# Altium integrated library 兰格封装.IntLib: 1176 symbols (part 4 of 6) (continued)
## RES  0603  15K
designator R?, comment 15K
0603  15K  5%  贴片电阻; 物料代码: 3.01.03.01.01.0026; 仓库名称: 元件仓; 助记码: 0603  15K  5%  TPDZ; 单位: ֻ; 加工方式: 贴片; 物料名称: 0603  15K  5%  贴片电阻; 规格型号: *
footprint R0603
pins: 1, 2
2 alternate drawings of the same symbol

## RES  0603  15R
designator R?, comment 15R
0603 15R 5% 贴片电阻; 物料代码: 3.01.03.01.01.0080; 助记码: 0603 15R 5% TPDZ; 仓库名称: 元件仓; 单位: ֻ; 加工方式: 贴片; 物料名称: 0603 15R 5% 贴片电阻; 规格型号: *
footprint R0603
pins: 1, 2
2 alternate drawings of the same symbol

## RES  0603  16K
designator R?, comment 16K
0603 16K 5% 贴片电阻; 物料代码: 3.01.03.01.01.0056; 仓库名称: 元件仓; 助记码: 0603 16K 5% TPDZ; 单位: ֻ; 加工方式: 贴片; 物料名称: 0603 16K 5% 贴片电阻; 规格型号: *
footprint R0603
pins: 1, 2
2 alternate drawings of the same symbol

## RES  0603  16R
designator R?, comment 16R
0603 16R 5% 贴片电阻; 物料代码: 3.01.03.01.01.0126; 助记码: 0603 16R 5% TPDZ; 仓库名称: 元件仓; 单位: ֻ; 加工方式: 贴片; 物料名称: 0603 16R 5% 贴片电阻; 规格型号: *
footprint R0603
pins: 1, 2
2 alternate drawings of the same symbol

## RES  0603  18K
designator R?, comment 18K
0603 18K 5% 贴片电阻; 物料代码: 3.01.03.01.01.0057; 仓库名称: 元件仓; 助记码: 0603 18K 5% TPDZ; 单位: ֻ; 加工方式: 贴片; 物料名称: 0603 18K 5% 贴片电阻; 规格型号: *
footprint R0603
pins: 1, 2
2 alternate drawings of the same symbol

## RES  0603  18R
designator R?, comment 18R
0603 18R 5% 贴片电阻; 物料代码: 3.01.03.01.01.0038; 助记码: 0603 18R 5% TPDZ; 仓库名称: 元件仓; 单位: ֻ; 加工方式: 贴片; 物料名称: 0603 18R 5% 贴片电阻; 规格型号: *
footprint R0603
pins: 1, 2
2 alternate drawings of the same symbol

## RES  0603  20K
designator R?, comment 20K
0603  20K  5%  贴片电阻; 物料代码: 3.01.03.01.01.0058; 仓库名称: 元件仓; 助记码: 0603  20K  5%  TPDZ; 单位: ֻ; 加工方式: 贴片; 物料名称: 0603  20K  5%  贴片电阻; 规格型号: *
footprint R0603
pins: 1, 2
2 alternate drawings of the same symbol

## RES  0603  20R
designator R?, comment 20R
0603 20R 5% 贴片电阻; 物料代码: 3.01.03.01.01.0127; 助记码: 0603 20R 5% TPDZ; 仓库名称: 元件仓; 单位: ֻ; 加工方式: 贴片; 物料名称: 0603 20R 5% 贴片电阻; 规格型号: *
footprint R0603
pins: 1, 2
2 alternate drawings of the same symbol

## RES  0603  22K
designator R?, comment 22K
0603  22K  5%  贴片电阻; 物料代码: 3.01.03.01.01.0008; 仓库名称: 元件仓; 单位: ֻ; 加工方式: 贴片; 物料名称: 0603  22K  5%  贴片电阻; 助记码: *; 规格型号: *
footprint R0603
pins: 1, 2
2 alternate drawings of the same symbol

## RES  0603  22R
designator R?, comment 22R
0603  22R  5%  贴片电阻; 物料代码: 3.01.03.01.01.0039; 助记码: 0603  22R  5%  TPDZ; 仓库名称: 元件仓; 单位: ֻ; 加工方式: 贴片; 物料名称: 0603  22R  5%  贴片电阻; 规格型号: *
footprint R0603
pins: 1, 2
2 alternate drawings of the same symbol

## RES  0603  24K
designator R?, comment 24K
0603 24K 5% 贴片电阻; 物料代码: 3.01.03.01.01.0059; 助记码: 0603 24K 5% TPDZ; 仓库名称: 元件仓; 单位: ֻ; 加工方式: 贴片; 物料名称: 0603 24K 5% 贴片电阻; 规格型号: *
footprint R0603
pins: 1, 2
2 alternate drawings of the same symbol

## RES  0603  24R
designator R?, comment 24R
0603 24R 5% 贴片电阻; 物料代码: 3.01.03.01.01.0128; 助记码: 0603 24R 5% TPDZ; 仓库名称: 元件仓; 单位: ֻ; 加工方式: 贴片; 物料名称: 0603 24R 5% 贴片电阻; 规格型号: *
footprint R0603
pins: 1, 2
2 alternate drawings of the same symbol

## RES  0603  27K
designator R?, comment 27K
0603  27K  5%  贴片电阻; 助记码: 0603  27K  5%  TPDZ; 物料代码: 3.01.03.01.01.0027; 仓库名称: 元件仓; 单位: ֻ; 加工方式: 贴片; 物料名称: 0603  27K  5%  贴片电阻; 规格型号: *
footprint R0603
pins: 1, 2
2 alternate drawings of the same symbol

## RES  0603  27R
designator R?, comment 27R
0603 27R 5% 贴片电阻; 物料代码: 3.01.03.01.01.0040; 助记码: 0603 27R 5% TPDZ; 仓库名称: 元件仓; 单位: ֻ; 加工方式: 贴片; 物料名称: 0603 27R 5% 贴片电阻; 规格型号: *
footprint R0603
pins: 1, 2
2 alternate drawings of the same symbol

## RES  0603  30R
designator R?, comment 30R
0603 30R 5% 贴片电阻; 物料代码: 3.01.03.01.01.0041; 助记码: 0603 30R 5% TPDZ; 仓库名称: 元件仓; 单位: ֻ; 加工方式: 贴片; 物料名称: 0603 30R 5% 贴片电阻; 规格型号: *
footprint R0603
pins: 1, 2
2 alternate drawings of the same symbol

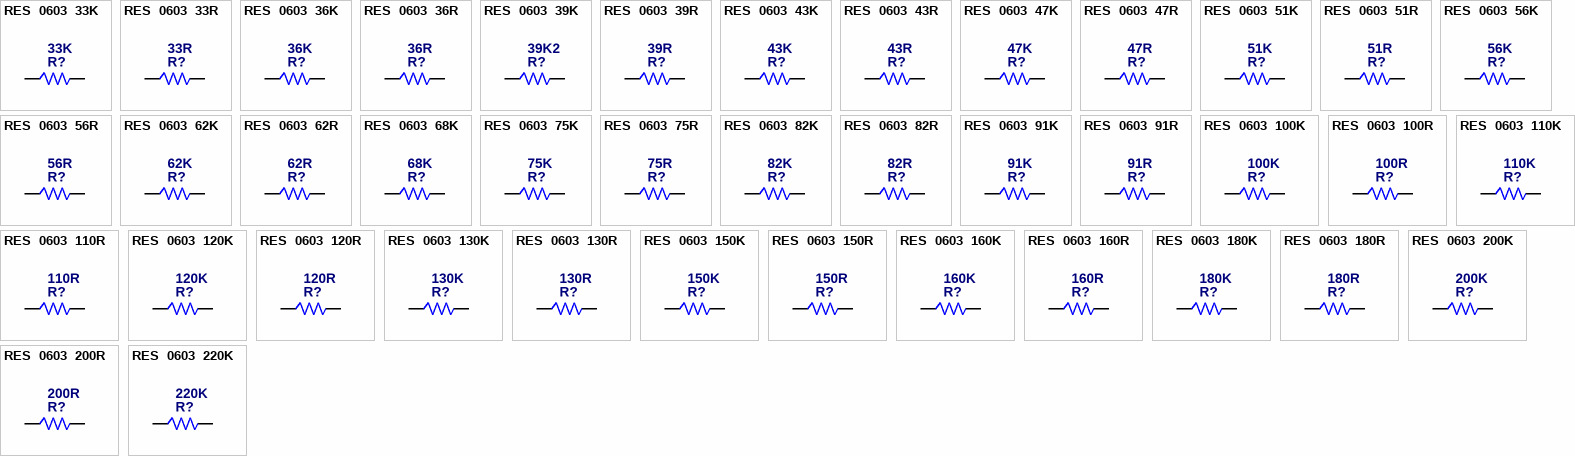
[diagram p37: symbols RES  0603  33K to RES  0603  220K]

## RES  0603  33K
designator R?, comment 33K
0603  33K  5%  贴片电阻; 物料代码: 3.01.03.01.01.0028; 仓库名称: 元件仓; 助记码: 0603  33K  5%  TPDZ; 单位: ֻ; 加工方式: 贴片; 物料名称: 0603  33K  5%  贴片电阻; 规格型号: *
footprint R0603
pins: 1, 2
2 alternate drawings of the same symbol

## RES  0603  33R
designator R?, comment 33R
0603  33R  5%  贴片电阻; 物料代码: 3.01.03.01.01.0081; 助记码: 0603  33R  5%  TPDZ; 仓库名称: 元件仓; 单位: ֻ; 加工方式: 贴片; 物料名称: 0603  33R  5%  贴片电阻; 规格型号: *
footprint R0603
pins: 1, 2
2 alternate drawings of the same symbol

## RES  0603  36K
designator R?, comment 36K
0603 36K 5% 贴片电阻; 物料代码: 3.01.03.01.01.0107; 仓库名称: 元件仓; 助记码: 0603 36K 5% TPDZ; 单位: ֻ; 加工方式: 贴片; 物料名称: 0603 36K 5% 贴片电阻; 规格型号: *
footprint R0603
pins: 1, 2
2 alternate drawings of the same symbol

## RES  0603  36R
designator R?, comment 36R
0603 36R 5% 贴片电阻; 物料代码: 3.01.03.01.01.0129; 助记码: 0603 36R 5% TPDZ; 仓库名称: 元件仓; 单位: ֻ; 加工方式: 贴片; 物料名称: 0603 36R 5% 贴片电阻; 规格型号: *
footprint R0603
pins: 1, 2
2 alternate drawings of the same symbol

## RES  0603  39K
designator R?, comment 39K2
0603  39K  5%  贴片电阻; 物料代码: 3.01.03.01.01.0108; 助记码: 0603  39K  5%  TPDZ; 仓库名称: 元件仓; 单位: ֻ; 加工方式: 贴片; 物料名称: 0603  39K  5%  贴片电阻; 规格型号: *
footprint R0603
pins: 1, 2
2 alternate drawings of the same symbol

## RES  0603  39R
designator R?, comment 39R
0603 39R 5% 贴片电阻; 物料代码: 3.01.03.01.01.0082; 助记码: 0603 39R 5% TPDZ; 仓库名称: 元件仓; 单位: ֻ; 加工方式: 贴片; 物料名称: 0603 39R 5% 贴片电阻; 规格型号: *
footprint R0603
pins: 1, 2
2 alternate drawings of the same symbol

## RES  0603  43K
designator R?, comment 43K
0603 43K 5% 贴片电阻; 物料代码: 3.01.03.01.01.0061; 仓库名称: 元件仓; 助记码: 0603 43K 5% TPDZ; 单位: ֻ; 加工方式: 贴片; 物料名称: 0603 43K 5% 贴片电阻; 规格型号: *
footprint R0603
pins: 1, 2
2 alternate drawings of the same symbol

## RES  0603  43R
designator R?, comment 43R
0603 43R 5% 贴片电阻; 物料代码: 3.01.03.01.01.0130; 单位: ֻ; 仓库名称: 元件仓; 助记码: 0603 43R 5% TPDZ; 加工方式: 贴片; 物料名称: 0603 43R 5% 贴片电阻; 规格型号: *
footprint R0603
pins: 1, 2
2 alternate drawings of the same symbol

## RES  0603  47K
designator R?, comment 47K
0603  47K  5%  贴片电阻; 物料代码: 3.01.03.01.01.0009; 仓库名称: 元件仓; 单位: ֻ; 加工方式: 贴片; 物料名称: 0603  47K  5%  贴片电阻; 规格型号: *; 助记码: *
footprint R0603
pins: 1, 2
2 alternate drawings of the same symbol

## RES  0603  47R
designator R?, comment 47R
0603  47R  5%  贴片电阻; 物料代码: 3.01.03.01.01.0013; 单位: ֻ; 仓库名称: 元件仓; 加工方式: 贴片; 物料名称: 0603  47R  5%  贴片电阻; 规格型号: *; 助记码: *
footprint R0603
pins: 1, 2
2 alternate drawings of the same symbol

## RES  0603  51K
designator R?, comment 51K
0603 51K 5% 贴片电阻; 物料代码: 3.01.03.01.01.0062; 仓库名称: 元件仓; 助记码: 0603 51K 5% TPDZ; 单位: ֻ; 加工方式: 贴片; 物料名称: 0603 51K 5% 贴片电阻; 规格型号: *
footprint R0603
pins: 1, 2
2 alternate drawings of the same symbol

## RES  0603  51R
designator R?, comment 51R
0603 51R 5% 贴片电阻; 物料代码: 3.01.03.01.01.0083; 仓库名称: 元件仓; 助记码: 0603 51R 5% TPDZ; 单位: ֻ; 加工方式: 贴片; 物料名称: 0603 51R 5% 贴片电阻; 规格型号: *
footprint R0603
pins: 1, 2
2 alternate drawings of the same symbol

## RES  0603  56K
designator R?, comment 56K
0603  56K  5%  贴片电阻; 物料代码: 3.01.03.01.01.0029; 仓库名称: 元件仓; 助记码: 0603  56K  5%  TPDZ; 单位: ֻ; 加工方式: 贴片; 物料名称: 0603  56K  5%  贴片电阻; 规格型号: *
footprint R0603
pins: 1, 2
2 alternate drawings of the same symbol

## RES  0603  56R
designator R?, comment 56R
0603 56R 5% 贴片电阻; 物料代码: 3.01.03.01.01.0084; 仓库名称: 元件仓; 助记码: 0603 56R 5% TPDZ; 单位: ֻ; 加工方式: 贴片; 物料名称: 0603 56R 5% 贴片电阻; 规格型号: *
footprint R0603
pins: 1, 2
2 alternate drawings of the same symbol

## RES  0603  62K
designator R?, comment 62K
0603 62K 5% 贴片电阻; 物料代码: 3.01.03.01.01.0063; 助记码: 0603 62K 5% TPDZ; 仓库名称: 元件仓; 单位: ֻ; 加工方式: 贴片; 物料名称: 0603 62K 5% 贴片电阻; 规格型号: *
footprint R0603
pins: 1, 2
2 alternate drawings of the same symbol

## RES  0603  62R
designator R?, comment 62R
0603 62R 5% 贴片电阻; 物料代码: 3.01.03.01.01.0085; 助记码: 0603 62R 5% TPDZ; 仓库名称: 元件仓; 单位: ֻ; 加工方式: 贴片; 物料名称: 0603 62R 5% 贴片电阻; 规格型号: *
footprint R0603
pins: 1, 2
2 alternate drawings of the same symbol

## RES  0603  68K
designator R?, comment 68K
0603  68K  5%  贴片电阻; 物料代码: 3.01.03.01.01.0064; 助记码: 0603  68K  5%  TPDZ; 仓库名称: 元件仓; 单位: ֻ; 加工方式: 贴片; 物料名称: 0603  68K  5%  贴片电阻; 规格型号: *
footprint R0603
pins: 1, 2
2 alternate drawings of the same symbol

## RES  0603  75K
designator R?, comment 75K
0603  75K  5%  贴片电阻; 物料代码: 3.01.03.01.01.0065; 助记码: 0603  75K  5%  TPDZ; 仓库名称: 元件仓; 单位: ֻ; 加工方式: 贴片; 物料名称: 0603  75K  5%  贴片电阻; 规格型号: *
footprint R0603
pins: 1, 2
2 alternate drawings of the same symbol

## RES  0603  75R
designator R?, comment 75R
0603  75R  5%  贴片电阻; 物料代码: 3.01.03.01.01.0014; 仓库名称: 元件仓; 单位: ֻ; 加工方式: 贴片; 物料名称: 0603  75R  5%  贴片电阻; 规格型号: *; 助记码: *
footprint R0603
pins: 1, 2
2 alternate drawings of the same symbol

## RES  0603  82K
designator R?, comment 82K
0603  82K  5%  贴片电阻; 物料代码: 3.01.03.01.01.0030; 助记码: 0603  82K  5%  TPDZ; 仓库名称: 元件仓; 单位: ֻ; 加工方式: 贴片; 物料名称: 0603  82K  5%  贴片电阻; 规格型号: *
footprint R0603
pins: 1, 2
2 alternate drawings of the same symbol

## RES  0603  82R
designator R?, comment 82R
0603 82R 5% 贴片电阻; 物料代码: 3.01.03.01.01.0086; 助记码: 0603 82R 5% TPDZ; 仓库名称: 元件仓; 单位: ֻ; 加工方式: 贴片; 物料名称: 0603 82R 5% 贴片电阻; 规格型号: *
footprint R0603
pins: 1, 2
2 alternate drawings of the same symbol

## RES  0603  91K
designator R?, comment 91K
0603  91K 5% 贴片电阻; 物料代码: 3.01.03.01.01.0109; 助记码: 0603 91K 5% TPDZ; 仓库名称: 元件仓; 单位: ֻ; 加工方式: 贴片; 物料名称: 0603 91K 5% 贴片电阻; 规格型号: *
footprint R0603
pins: 1, 2
2 alternate drawings of the same symbol

## RES  0603  91R
designator R?, comment 91R
0603 91R 5% 贴片电阻; 物料代码: 3.01.03.01.01.0135; 助记码: 0603 91R 5% TPDZ; 仓库名称: 元件仓; 单位: ֻ; 加工方式: 贴片; 物料名称: 0603 91R 5% 贴片电阻; 规格型号: *
footprint R0603
pins: 1, 2
2 alternate drawings of the same symbol

## RES  0603  100K
designator R?, comment 100K
0603  100K  5%  贴片电阻; 物料代码: 3.01.03.01.01.0010; 仓库名称: 元件仓; 单位: ֻ; 加工方式: 贴片; 物料名称: 0603  100K  5%  贴片电阻; 规格型号: *; 助记码: *
footprint R0603
pins: 1, 2
2 alternate drawings of the same symbol

## RES  0603  100R
designator R?, comment 100R
0603  100R  5%  贴片电阻; 物料代码: 3.01.03.01.01.0015; 仓库名称: 元件仓; 单位: ֻ; 加工方式: 贴片; 物料名称: 0603  100R  5%  贴片电阻; 助记码: *; 规格型号: *
footprint R0603
pins: 1, 2
2 alternate drawings of the same symbol

## RES  0603  110K
designator R?, comment 110K
0603 110K 5% 贴片电阻; 物料代码: 3.01.03.01.01.0146; 助记码: 0603 110K 5% TPDZ; 仓库名称: 元件仓; 单位: ֻ; 加工方式: 贴片; 物料名称: 0603 110K 5% 贴片电阻; 规格型号: *
footprint R0603
pins: 1, 2
2 alternate drawings of the same symbol

## RES  0603  110R
designator R?, comment 110R
0603 110R 5% 贴片电阻; 物料代码: 3.01.03.01.01.0151; 仓库名称: 元件仓; 助记码: 0603 110R 5% TPDZ; 单位: ֻ; 加工方式: 贴片; 物料名称: 0603 110R 5% 贴片电阻; 规格型号: *
footprint R0603
pins: 1, 2
2 alternate drawings of the same symbol

## RES  0603  120K
designator R?, comment 120K
0603 120K 5% 贴片电阻; 物料代码: 3.01.03.01.01.0066; 助记码: 0603 120K 5% TPDZ; 仓库名称: 元件仓; 单位: ֻ; 加工方式: 贴片; 物料名称: 0603 120K 5% 贴片电阻; 规格型号: *
footprint R0603
pins: 1, 2
2 alternate drawings of the same symbol

## RES  0603  120R
designator R?, comment 120R
0603 120R 5% 贴片电阻; 物料代码: 3.01.03.01.01.0087; 助记码: 0603 120R 5% TPDZ; 仓库名称: 元件仓; 单位: ֻ; 加工方式: 贴片; 物料名称: 0603 120R 5% 贴片电阻; 规格型号: *
footprint R0603
pins: 1, 2
2 alternate drawings of the same symbol

## RES  0603  130K
designator R?, comment 130K
0603 130K 5% 贴片电阻; 物料代码: 3.01.03.01.01.0110; 助记码: 0603 130K 5% TPDZ; 仓库名称: 元件仓; 单位: ֻ; 加工方式: 贴片; 物料名称: 0603 130K 5% 贴片电阻; 规格型号: *
footprint R0603
pins: 1, 2
2 alternate drawings of the same symbol

## RES  0603  130R
designator R?, comment 130R
0603 130R 5% 贴片电阻; 物料代码: 3.01.03.01.01.0142; 助记码: 0603 130R 5% TPDZ; 仓库名称: 元件仓; 单位: ֻ; 加工方式: 贴片; 物料名称: 0603 130R 5% 贴片电阻; 规格型号: *
footprint R0603
pins: 1, 2
2 alternate drawings of the same symbol

## RES  0603  150K
designator R?, comment 150K
0603  150K  5%  贴片电阻; 物料代码: 3.01.03.01.01.0031; 助记码: 0603  150K  5%  TPDZ; 仓库名称: 元件仓; 单位: ֻ; 加工方式: 贴片; 物料名称: 0603  150K  5%  贴片电阻; 规格型号: *
footprint R0603
pins: 1, 2
2 alternate drawings of the same symbol

## RES  0603  150R
designator R?, comment 150R
0603  150R  5%  贴片电阻; 物料代码: 3.01.03.01.01.0088; 仓库名称: 元件仓; 助记码: 0603  150R  5%  TPDZ; 单位: ֻ; 加工方式: 贴片; 物料名称: 0603  150R  5%  贴片电阻; 规格型号: *
footprint R0603
pins: 1, 2
2 alternate drawings of the same symbol

## RES  0603  160K
designator R?, comment 160K
0603 160K 5% 贴片电阻; 物料代码: 3.01.03.01.01.0147; 助记码: 0603 160K 5% TPDZ; 仓库名称: 元件仓; 单位: ֻ; 加工方式: 贴片; 物料名称: 0603 160K 5% 贴片电阻; 规格型号: *
footprint R0603
pins: 1, 2
2 alternate drawings of the same symbol

## RES  0603  160R
designator R?, comment 160R
0603 160R 5% 贴片电阻; 物料代码: 3.01.03.01.01.0143; 仓库名称: 元件仓; 助记码: 0603 160R 5% TPDZ; 单位: ֻ; 加工方式: 贴片; 物料名称: 0603 160R 5% 贴片电阻; 规格型号: *
footprint R0603
pins: 1, 2
2 alternate drawings of the same symbol

## RES  0603  180K
designator R?, comment 180K
0603 180K 5% 贴片电阻; 物料代码: 3.01.03.01.01.0067; 助记码: 0603 180K 5% TPDZ; 仓库名称: 元件仓; 单位: ֻ; 加工方式: 贴片; 物料名称: 0603 180K 5% 贴片电阻; 规格型号: *
footprint R0603
pins: 1, 2
2 alternate drawings of the same symbol

## RES  0603  180R
designator R?, comment 180R
0603 180R 5% 贴片电阻; 物料代码: 3.01.03.01.01.0089; 仓库名称: 元件仓; 助记码: 0603 180R 5% TPDZ; 单位: ֻ; 加工方式: 贴片; 物料名称: 0603 180R 5% 贴片电阻; 规格型号: *
footprint R0603
pins: 1, 2
2 alternate drawings of the same symbol

## RES  0603  200K
designator R?, comment 200K
0603  200K  5%  贴片电阻; 物料代码: 3.01.03.01.01.0068; 仓库名称: 元件仓; 助记码: 0603  200K  5%  TPDZ; 单位: ֻ; 加工方式: 贴片; 物料名称: 0603  200K  5%  贴片电阻; 规格型号: *
footprint R0603
pins: 1, 2
2 alternate drawings of the same symbol

## RES  0603  200R
designator R?, comment 200R
0603 200R 5% 贴片电阻; 物料代码: 3.01.03.01.01.0090; 仓库名称: 元件仓; 助记码: 0603 200R 5% TPDZ; 单位: ֻ; 加工方式: 贴片; 物料名称: 0603 200R 5% 贴片电阻; 规格型号: *
footprint R0603
pins: 1, 2
2 alternate drawings of the same symbol

## RES  0603  220K
designator R?, comment 220K
0603  220K  5%  贴片电阻; 助记码: 0603  220K  5%  TPDZ; 物料代码: 3.01.03.01.01.0069; 仓库名称: 元件仓; 单位: ֻ; 加工方式: 贴片; 物料名称: 0603  220K  5%  贴片电阻; 规格型号: *
footprint R0603
pins: 1, 2
2 alternate drawings of the same symbol

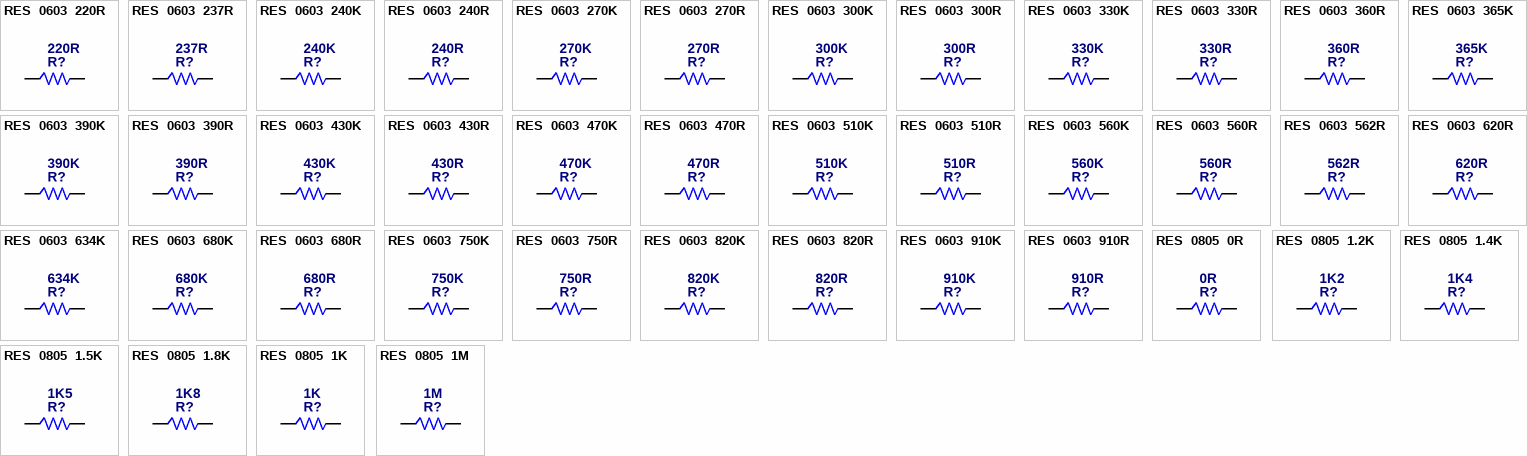
[diagram p38: symbols RES  0603  220R to RES  0805  1M]

## RES  0603  220R
designator R?, comment 220R
0603  220R  5%  贴片电阻; 物料代码: 3.01.03.01.01.0033; 仓库名称: 元件仓; 助记码: 0603  220R  5%  TPDZ; 单位: ֻ; 加工方式: 贴片; 物料名称: 0603  220R  5%  贴片电阻; 规格型号: *
footprint R0603
pins: 1, 2
2 alternate drawings of the same symbol

## RES  0603  237R
designator R?, comment 237R
0603  237R  1%  贴片电阻; 单位: ֻ; 仓库名称: 元件仓; 物料代码: 3.01.03.01.01.0016; 加工方式: 贴片; 物料名称: 0603  237R  1%  贴片电阻; 助记码: *; 规格型号: *
footprint R0603
pins: 1, 2
2 alternate drawings of the same symbol

## RES  0603  240K
designator R?, comment 240K
0603 240K 5% 贴片电阻; 助记码: 0603 240K 5% TPDZ; 物料代码: 3.01.03.01.01.0112; 仓库名称: 元件仓; 单位: ֻ; 加工方式: 贴片; 物料名称: 0603 240K 5% 贴片电阻; 规格型号: *
footprint R0603
pins: 1, 2
2 alternate drawings of the same symbol

## RES  0603  240R
designator R?, comment 240R
0603 240R 5% 贴片电阻; 物料代码: 3.01.03.01.01.0131; 仓库名称: 元件仓; 助记码: 0603 240R 5% TPDZ; 单位: ֻ; 加工方式: 贴片; 物料名称: 0603 240R 5% 贴片电阻; 规格型号: *
footprint R0603
pins: 1, 2
2 alternate drawings of the same symbol

## RES  0603  270K
designator R?, comment 270K
0603  270K  5%  贴片电阻; 物料代码: 3.01.03.01.01.0070; 仓库名称: 元件仓; 助记码: 0603  270K  5%  TPDZ; 单位: ֻ; 加工方式: 贴片; 物料名称: 0603  270K  5%  贴片电阻; 规格型号: *
footprint R0603
pins: 1, 2
2 alternate drawings of the same symbol

## RES  0603  270R
designator R?, comment 270R
0603  270R  5%  贴片电阻; 物料代码: 3.01.03.01.01.0091; 仓库名称: 元件仓; 助记码: 0603  270R  5%  TPDZ; 单位: ֻ; 加工方式: 贴片; 物料名称: 0603  270R  5%  贴片电阻; 规格型号: *
footprint R0603
pins: 1, 2
2 alternate drawings of the same symbol

## RES  0603  300K
designator R?, comment 300K
0603 300K 5% 贴片电阻; 物料代码: 3.01.03.01.01.0071; 仓库名称: 元件仓; 助记码: 0603 300K 5% TPDZ; 单位: ֻ; 加工方式: 贴片; 物料名称: 0603 300K 5% 贴片电阻; 规格型号: *
footprint R0603
pins: 1, 2
2 alternate drawings of the same symbol

## RES  0603  300R
designator R?, comment 300R
0603 300R 5% 贴片电阻; 物料代码: 3.01.03.01.01.0144; 仓库名称: 元件仓; 助记码: 0603 300R 5% TPDZ; 单位: ֻ; 加工方式: 贴片; 物料名称: 0603 300R 5% 贴片电阻; 规格型号: *
footprint R0603
pins: 1, 2
2 alternate drawings of the same symbol

## RES  0603  330K
designator R?, comment 330K
0603 330K 5% 贴片电阻; 物料代码: 3.01.03.01.01.0072; 仓库名称: 元件仓; 助记码: 0603 330K 5% TPDZ; 单位: ֻ; 加工方式: 贴片; 物料名称: 0603 330K 5% 贴片电阻; 规格型号: *
footprint R0603
pins: 1, 2
2 alternate drawings of the same symbol

## RES  0603  330R
designator R?, comment 330R
0603  330R  5%  贴片电阻; 物料代码: 3.01.03.01.01.0017; 仓库名称: 元件仓; 单位: ֻ; 加工方式: 贴片; 物料名称: 0603  330R  5%  贴片电阻; 助记码: *; 规格型号: *
footprint R0603
pins: 1, 2
2 alternate drawings of the same symbol

## RES  0603  360R
designator R?, comment 360R
0603 360R 5% 贴片电阻; 物料代码: 3.01.03.01.01.0136; 仓库名称: 元件仓; 助记码: 0603 360R 5% TPDZ; 单位: ֻ; 加工方式: 贴片; 物料名称: 0603 360R 5% 贴片电阻; 规格型号: *
footprint R0603
pins: 1, 2
2 alternate drawings of the same symbol

## RES  0603  365K
designator R?, comment 365K
0603  365K  1%  贴片电阻; 仓库名称: 元件仓; 物料代码: 3.01.03.01.01.0011; 单位: ֻ; 加工方式: 贴片; 物料名称: 0603  365K  1%  贴片电阻; 助记码: *; 规格型号: *
footprint R0603
pins: 1, 2
2 alternate drawings of the same symbol

## RES  0603  390K
designator R?, comment 390K
0603 390K 5% 贴片电阻; 物料代码: 3.01.03.01.01.0098; 仓库名称: 元件仓; 助记码: 0603 390K 5% TPDZ; 单位: ֻ; 加工方式: 贴片; 物料名称: 0603 390K 5% 贴片电阻; 规格型号: *
footprint R0603
pins: 1, 2
2 alternate drawings of the same symbol

## RES  0603  390R
designator R?, comment 390R
0603 390R 5% 贴片电阻; 物料代码: 3.01.03.01.01.0137; 仓库名称: 元件仓; 助记码: 0603 390R 5% TPDZ; 单位: ֻ; 加工方式: 贴片; 物料名称: 0603 390R 5% 贴片电阻; 规格型号: *
footprint R0603
pins: 1, 2
2 alternate drawings of the same symbol

## RES  0603  430K
designator R?, comment 430K
0603  430K  5%  贴片电阻; 物料代码: 3.01.03.01.01.0139; 仓库名称: 元件仓; 单位: ֻ; 加工方式: 贴片; 物料名称: 0603  430K  5%  贴片电阻; 规格型号: *
footprint R0603
pins: 1, 2
2 alternate drawings of the same symbol

## RES  0603  430R
designator R?, comment 430R
0603 430R 5% 贴片电阻; 物料代码: 3.01.03.01.01.0138; 助记码: 0603 430R 5% TPDZ; 仓库名称: 元件仓; 单位: ֻ; 加工方式: 贴片; 物料名称: 0603 430R 5% 贴片电阻; 规格型号: *
footprint R0603
pins: 1, 2
2 alternate drawings of the same symbol

## RES  0603  470K
designator R?, comment 470K
0603  470K  5%  贴片电阻; 物料代码: 3.01.03.01.01.0099; 助记码: 0603  470K  5%  TPDZ; 仓库名称: 元件仓; 单位: ֻ; 加工方式: 贴片; 物料名称: 0603  470K  5%  贴片电阻; 规格型号: *
footprint R0603
pins: 1, 2
2 alternate drawings of the same symbol

## RES  0603  470R
designator R?, comment 470R
0603  470R  5%  贴片电阻; 物料代码: 3.01.03.01.01.0032; 助记码: 0603  470R  TPDZ; 仓库名称: 元件仓; 单位: ֻ; 加工方式: 贴片; 物料名称: 0603  470R  5%  贴片电阻; 规格型号: *
footprint R0603
pins: 1, 2
2 alternate drawings of the same symbol

## RES  0603  510K
designator R?, comment 510K
0603 510K 5% 贴片电阻; 物料代码: 3.01.03.01.01.0100; 助记码: 0603 510K 5% TPDZ; 仓库名称: 元件仓; 单位: ֻ; 加工方式: 贴片; 物料名称: 0603 510K 5% 贴片电阻; 规格型号: *
footprint R0603
pins: 1, 2
2 alternate drawings of the same symbol

## RES  0603  510R
designator R?, comment 510R
0603  510R  5%  贴片电阻; 物料代码: 3.01.03.01.01.0092; 助记码: 0603  510R  5%  TPDZ; 仓库名称: 元件仓; 单位: ֻ; 加工方式: 贴片; 物料名称: 0603  510R  5%  贴片电阻; 规格型号: *
footprint R0603
pins: 1, 2
2 alternate drawings of the same symbol

## RES  0603  560K
designator R?, comment 560K
0603 560K 5% 贴片电阻; 物料代码: 3.01.03.01.01.0101; 助记码: 0603 560K 5% TPDZ; 仓库名称: 元件仓; 单位: ֻ; 加工方式: 贴片; 物料名称: 0603 560K 5% 贴片电阻; 规格型号: *
footprint R0603
pins: 1, 2
2 alternate drawings of the same symbol

## RES  0603  560R
designator R?, comment 560R
0603 560R 5% 贴片电阻; 物料代码: 3.01.03.01.01.0093; 单位: ֻ; 助记码: 0603 560R 5% TPDZ; 仓库名称: 元件仓; 加工方式: 贴片; 物料名称: 0603 560R 5% 贴片电阻; 规格型号: *
footprint R0603
pins: 1, 2
2 alternate drawings of the same symbol

## RES  0603  562R
designator R?, comment 562R
0603  562R  5%  贴片电阻; 物料代码: 3.01.03.01.01.0093; 单位: ֻ; 助记码: 0603  562R  5%  TPDZ; 仓库名称: 元件仓; 加工方式: 贴片; 物料名称: 0603  562R  5%  贴片电阻; 规格型号: *
footprint R0603
pins: 1, 2
2 alternate drawings of the same symbol

## RES  0603  620R
designator R?, comment 620R
0603 620R 5% 贴片电阻; 物料代码: 3.01.03.01.01.0094; 助记码: 0603 620R 5% TPDZ; 仓库名称: 元件仓; 单位: ֻ; 加工方式: 贴片; 物料名称: 0603 620R 5% 贴片电阻; 规格型号: *
footprint R0603
pins: 1, 2
2 alternate drawings of the same symbol

## RES  0603  634K
designator R?, comment 634K
0603  634K  1%  贴片电阻; 物料代码: 3.01.03.01.01.0012; 仓库名称: 元件仓; 单位: ֻ; 加工方式: 贴片; 物料名称: 0603  634K  1%  贴片电阻; 规格型号: *; 助记码: *
footprint R0603
pins: 1, 2
2 alternate drawings of the same symbol

## RES  0603  680K
designator R?, comment 680K
0603 680K 5% 贴片电阻; 物料代码: 3.01.03.01.01.0102; 助记码: 0603 680K 5% TPDZ; 仓库名称: 元件仓; 单位: ֻ; 加工方式: 贴片; 物料名称: 0603 680K 5% 贴片电阻; 规格型号: *
footprint R0603
pins: 1, 2
2 alternate drawings of the same symbol

## RES  0603  680R
designator R?, comment 680R
0603 680R 5% 贴片电阻; 物料代码: 3.01.03.01.01.0034; 助记码: 0603 680R 5% TPDZ; 仓库名称: 元件仓; 单位: ֻ; 加工方式: 贴片; 物料名称: 0603 680R 5% 贴片电阻; 规格型号: *
footprint R0603
pins: 1, 2
2 alternate drawings of the same symbol

## RES  0603  750K
designator R?, comment 750K
0603 750K 5% 贴片电阻; 助记码: 0603 750K 5% TPDZ; 物料代码: 3.01.03.01.01.0111; 仓库名称: 元件仓; 单位: ֻ; 加工方式: 贴片; 物料名称: 0603 750K 5% 贴片电阻; 规格型号: *
footprint R0603
pins: 1, 2
2 alternate drawings of the same symbol

## RES  0603  750R
designator R?, comment 750R
0603  750R  5%  贴片电阻; 助记码: 0603  750R  5%  TPDZ; 物料代码: 3.01.03.01.01.0095; 仓库名称: 元件仓; 单位: ֻ; 加工方式: 贴片; 物料名称: 0603  750R  5%  贴片电阻; 规格型号: *
footprint R0603
pins: 1, 2
2 alternate drawings of the same symbol

## RES  0603  820K
designator R?, comment 820K
0603 820K 5% 贴片电阻; 助记码: 0603 820K 5% TPDZ; 物料代码: 3.01.03.01.01.0103; 仓库名称: 元件仓; 单位: ֻ; 加工方式: 贴片; 物料名称: 0603 820K 5% 贴片电阻; 规格型号: *
footprint R0603
pins: 1, 2
2 alternate drawings of the same symbol

## RES  0603  820R
designator R?, comment 820R
0603 820R 5% 贴片电阻; 助记码: 0603 820R 5% TPDZ; 物料代码: 3.01.03.01.01.0096; 仓库名称: 元件仓; 单位: ֻ; 加工方式: 贴片; 物料名称: 0603 820R 5% 贴片电阻; 规格型号: *
footprint R0603
pins: 1, 2
2 alternate drawings of the same symbol

## RES  0603  910K
designator R?, comment 910K
0603 910K 5% 贴片电阻; 物料代码: 3.01.03.01.01.0104; 助记码: 0603 910K 5% TPDZ; 仓库名称: 元件仓; 单位: ֻ; 加工方式: 贴片; 物料名称: 0603 910K 5% 贴片电阻; 规格型号: *
footprint R0603
pins: 1, 2
2 alternate drawings of the same symbol

## RES  0603  910R
designator R?, comment 910R
0603 910R 5% 贴片电阻; 物料代码: 3.01.03.01.01.0097; 助记码: 0603 910R 5% TPDZ; 仓库名称: 元件仓; 单位: ֻ; 加工方式: 贴片; 物料名称: 0603 910R 5% 贴片电阻; 规格型号: *
footprint R0603
pins: 1, 2
2 alternate drawings of the same symbol

## RES  0805  0R
designator R?, comment 0R
0805  0R  5%  HS  贴片电阻; 物料代码: 3.01.03.01.02.0066; 助记码: 0805  0R  5%  HSTPDZ; 仓库名称: 元件仓; 单位: ֻ; 加工方式: 贴片; 物料名称: 0805  0R  5%  HS  贴片电阻; 规格型号: *
footprint R0805
pins: 1, 2
2 alternate drawings of the same symbol

## RES  0805  1.2K
designator R?, comment 1K2
0805  1.2K  5%  HS  贴片电阻; 助记码: 0805  1.2K  5%  HS  TPDZ; 物料代码: 3.01.03.01.02.0020; 仓库名称: 元件仓; 单位: ֻ; 加工方式: 贴片; 物料名称: 0805  1.2K  5%  HS  贴片电阻; 规格型号: *
footprint R0805
pins: 1, 2
2 alternate drawings of the same symbol

## RES  0805  1.4K
designator R?, comment 1K4
0805 1.4K 1% HS 贴片电阻; 助记码: 0805 1.4K 1% HS TPDZ; 物料代码: 3.01.03.01.02.0072; 仓库名称: 元件仓; 单位: ֻ; 加工方式: 贴片; 物料名称: 0805 1.4K 1% HS 贴片电阻; 规格型号: *
footprint R0805
pins: 1, 2
2 alternate drawings of the same symbol

## RES  0805  1.5K
designator R?, comment 1K5
0805  1.5K  5%  HS  贴片电阻; 助记码: 0805  1.5K  5%  HS  TPDZ; 物料代码: 3.01.03.01.02.0021; 仓库名称: 元件仓; 单位: ֻ; 加工方式: 贴片; 物料名称: 0805  1.5K  5%  HS  贴片电阻; 规格型号: *
footprint R0805
pins: 1, 2
2 alternate drawings of the same symbol

## RES  0805  1.8K
designator R?, comment 1K8
0805  1.8K  5%  HS  贴片电阻; 物料代码: 3.01.03.01.02.0022; 仓库名称: 元件仓; 助记码: 0805  1.8K  5%  HS  TPDZ; 单位: ֻ; 加工方式: 贴片; 物料名称: 0805  1.8K  5%  HS  贴片电阻; 规格型号: *
footprint R0805
pins: 1, 2
2 alternate drawings of the same symbol

## RES  0805  1K
designator R?, comment 1K
0805  1K  5%  HS  贴片电阻; 助记码: 0805  1K  5%  HS  TPDZ; 物料代码: 3.01.03.01.02.0019; 仓库名称: 元件仓; 单位: ֻ; 加工方式: 贴片; 物料名称: 0805  1K  5%  HS  贴片电阻; 规格型号: *
footprint R0805
pins: 1, 2
2 alternate drawings of the same symbol

## RES  0805  1M
designator R?, comment 1M
0805  1M  5%  HS  贴片电阻; 助记码: 0805  1M  5%  HS  TPDZ; 物料代码: 3.01.03.01.02.0006; 仓库名称: 元件仓; 单位: ֻ; 加工方式: 贴片; 物料名称: 0805  1M  5%  HS  贴片电阻; 规格型号: *
footprint R0805
pins: 1, 2
2 alternate drawings of the same symbol

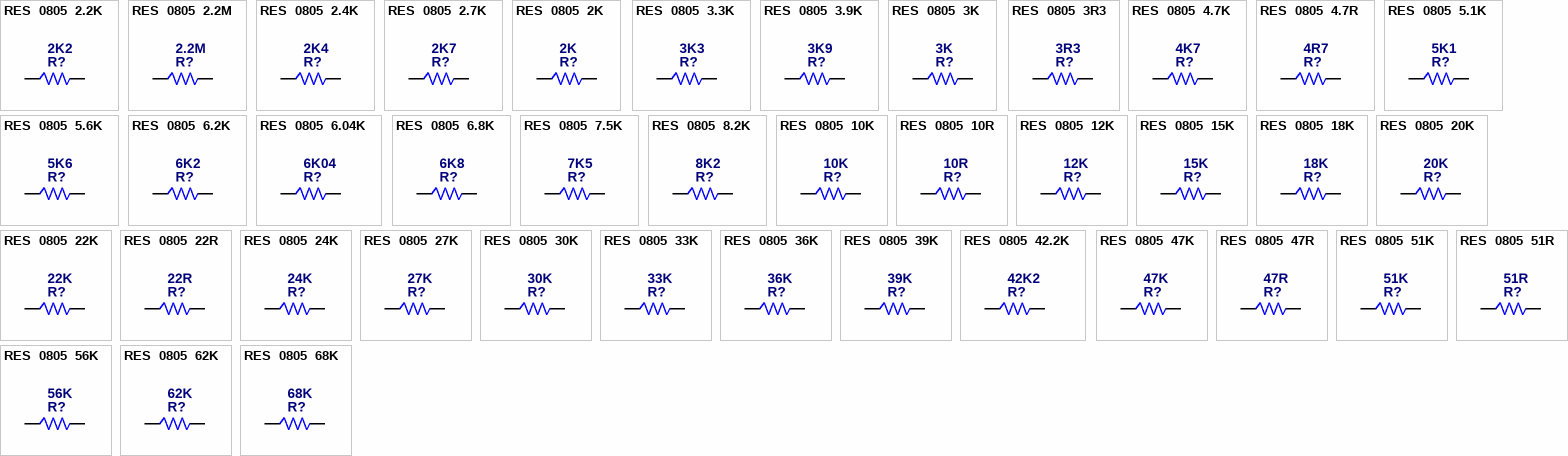
[diagram p39: symbols RES  0805  2.2K to RES  0805  68K]

## RES  0805  2.2K
designator R?, comment 2K2
0805  2.2K  5%  HS  贴片电阻; 助记码: 0805  2.2K  5%  HS  TPDZ; 物料代码: 3.01.03.01.02.0024; 仓库名称: 元件仓; 单位: ֻ; 加工方式: 贴片; 物料名称: 0805  2.2K  5%  HS  贴片电阻; 规格型号: *
footprint R0805
pins: 1, 2
2 alternate drawings of the same symbol

## RES  0805  2.2M
designator R?, comment 2.2M
0805  2.2M  5%  HS  贴片电阻; 助记码: 0805  2.2M  5%  HS  TPDZ; 仓库名称: 元件仓; 物料代码: 3.01.03.01.02.0063; 单位: ֻ; 加工方式: 贴片; 物料名称: 0805  2.2M  5%  HS  贴片电阻; 规格型号: *
footprint R0805
pins: 1, 2
2 alternate drawings of the same symbol

## RES  0805  2.4K
designator R?, comment 2K4
0805  2.4K  5%  HS  贴片电阻; 助记码: 0805  2.4K  5%  HS  TPDZ; 物料代码: 3.01.03.01.02.0025; 仓库名称: 元件仓; 单位: ֻ; 加工方式: 贴片; 物料名称: 0805  2.4K  5%  HS  贴片电阻; 规格型号: *
footprint R0805
pins: 1, 2
2 alternate drawings of the same symbol

## RES  0805  2.7K
designator R?, comment 2K7
0805  2.7K  5%  HS  贴片电阻; 助记码: 0805  2.7K  5%  HS  TPDZ; 物料代码: 3.01.03.01.02.0001; 仓库名称: 元件仓; 单位: ֻ; 加工方式: 贴片; 物料名称: 0805  2.7K  5%  HS  贴片电阻; 规格型号: *
footprint R0805
pins: 1, 2
2 alternate drawings of the same symbol

## RES  0805  2K
designator R?, comment 2K
0805  2K  5%  HS  贴片电阻; 助记码: 0805  2K  5%  HS  TPDZ; 物料代码: 3.01.03.01.02.0023; 仓库名称: 元件仓; 单位: ֻ; 加工方式: 贴片; 物料代码: 0805  2K  5%  HS  贴片电阻; 规格型号: *
footprint R0805
pins: 1, 2
2 alternate drawings of the same symbol

## RES  0805  3.3K
designator R?, comment 3K3
0805  3.3K  5%  HS  贴片电阻; 助记码: 0805  3.3K  5%  HS  TPDZ; 物料代码: 3.01.03.01.02.0027; 仓库名称: 元件仓; 单位: ֻ; 加工方式: 贴片; 规格型号: *; 物料名称: 0805  3.3K  5%  HS  贴片电阻
footprint R0805
pins: 1, 2
2 alternate drawings of the same symbol

## RES  0805  3.9K
designator R?, comment 3K9
0805  3.9K  5%  HS  贴片电阻; 助记码: 0805  3.9K  5%  HS  TPDZ; 物料代码: 3.01.03.01.02.0065; 仓库名称: 元件仓; 单位: ֻ; 加工方式: 贴片; 物料名称: 0805  3.9K  5%  HS  贴片电阻; 规格型号: *
footprint R0805
pins: 1, 2
2 alternate drawings of the same symbol

## RES  0805  3K
designator R?, comment 3K
0805  3K  5%  HS  贴片电阻; 物料代码: 3.01.03.01.02.0026; 助记码: 0805  3K  5%  HS  TPDZ; 仓库名称: 元件仓; 单位: ֻ; 加工方式: 贴片; 物料名称: 0805  3K  5%  HS  贴片电阻; 规格型号: *
footprint R0805
pins: 1, 2
2 alternate drawings of the same symbol

## RES  0805  3R3
designator R?, comment 3R3
（查不到）0805  3R3  5%  HS  贴片电阻; 加工方式: 贴片; 仓库名称: 元件仓; 单位: ֻ; 物料代码: *; 物料名称: *; 助记码: *; 规格型号: *; 备注: *
footprint R0805
pins: 1, 2
2 alternate drawings of the same symbol

## RES  0805  4.7K
designator R?, comment 4K7
0805  4.7K  5%  HS  贴片电阻; 助记码: 0805  4.7K  5%  HS TPDZ; 物料代码: 3.01.03.01.02.0028; 仓库名称: 元件仓; 单位: ֻ; 加工方式: 贴片; 物料名称: 0805  4.7K  5%  HS  贴片电阻; 规格型号: *
footprint R0805
pins: 1, 2
2 alternate drawings of the same symbol

## RES  0805  4.7R
designator R?, comment 4R7
0805 4.7R 5% HS 贴片电阻; 助记码: 0805 4.7R 5% HS TPDZ; 物料代码: 3.01.03.01.02.0067; 仓库名称: 元件仓; 单位: ֻ; 加工方式: 贴片; 物料名称: 0805 4.7R 5% HS 贴片电阻; 规格型号: *
footprint R0805
pins: 1, 2
2 alternate drawings of the same symbol

## RES  0805  5.1K
designator R?, comment 5K1
0805  5.1K  5%  HS  贴片电阻; 助记码: 0805  5.1K  5%  HS  TPDZ; 物料代码: 3.01.03.01.02.0029; 仓库名称: 元件仓; 单位: ֻ; 加工方式: 贴片; 物料名称: 0805  5.1K  5%  HS  贴片电阻; 规格型号: *
footprint R0805
pins: 1, 2
2 alternate drawings of the same symbol

## RES  0805  5.6K
designator R?, comment 5K6
0805  5K6  5%  HS  贴片电阻; 助记码: 0805  5K6  5%  HS  TPDZ; 物料代码: 3.01.03.01.02.0030; 仓库名称: 元件仓; 单位: ֻ; 加工方式: 贴片; 物料名称: 0805  5K6  5%  HS  贴片电阻; 规格型号: *
footprint R0805
pins: 1, 2
2 alternate drawings of the same symbol

## RES  0805  6.2K
designator R?, comment 6K2
0805  6.2K  5%  HS  贴片电阻; 助记码: 0805  6.2K  5%  HS  TPDZ; 仓库名称: 元件仓; 物料代码: 3.01.03.01.02.0031; 单位: ֻ; 加工方式: 贴片; 规格型号: *; 物料代码: 0805  6.2K  5%  HS  贴片电阻
footprint R0805
pins: 1, 2
2 alternate drawings of the same symbol

## RES  0805  6.04K
designator R?, comment 6K04
0805 6.04K 1% HS 贴片电阻; 助记码: 0805 6.04K 1% HS TPD; 仓库名称: 元件仓; 物料代码: 3.01.03.01.02.0073; 单位: ֻ; 加工方式: 贴片; 规格型号: *; 物料代码: 0805 6.04K 1% HS 贴片电阻
footprint R0805
pins: 1, 2
2 alternate drawings of the same symbol

## RES  0805  6.8K
designator R?, comment 6K8
0805  6.8K  5%  HS  贴片电阻; 助记码: 0805  6.8K  5%  HS  TPDZ; 物料代码: 3.01.03.01.02.0032; 仓库名称: 元件仓; 单位: ֻ; 加工方式: 贴片; 物料名称: 0805  6.8K  5%  HS  贴片电阻; 规格型号: *
footprint R0805
pins: 1, 2
2 alternate drawings of the same symbol

## RES  0805  7.5K
designator R?, comment 7K5
0805  7.5K  5%  HS  贴片电阻; 助记码: 0805  7.5K  5%  HS  TPDZ; 物料代码: 3.01.03.01.02.0002; 仓库名称: 元件仓; 单位: ֻ; 加工方式: 贴片; 物料名称: 0805  7.5K  5%  HS  贴片电阻; 规格型号: *
footprint R0805
pins: 1, 2
2 alternate drawings of the same symbol

## RES  0805  8.2K
designator R?, comment 8K2
0805  8.2K  5%  HS  贴片电阻; 助记码: 0805  8.2K  5%  HS  TPDZ; 物料代码: 3.01.03.01.02.0033; 仓库名称: 元件仓; 单位: ֻ; 加工方式: 贴片; 物料名称: 0805  8.2K  5%  HS  贴片电阻; 规格型号: *
footprint R0805
pins: 1, 2
2 alternate drawings of the same symbol

## RES  0805  10K
designator R?, comment 10K
0805  10K  5%  HS  贴片电阻; 物料代码: 3.01.03.01.02.0004; 仓库名称: 元件仓; 助记码: 0805  10K  5%  HS  TPDZ; 单位: ֻ; 加工方式: 贴片; 物料名称: 0805  10K  5%  HS  贴片电阻; 规格型号: *
footprint R0805
pins: 1, 2
2 alternate drawings of the same symbol

## RES  0805  10R
designator R?, comment 10R
0805  10R  5%  HS  贴片电阻; 物料代码: 3.01.03.01.02.0007; 单位: ֻ; 助记码: 0805  10R  5%  HS  TPDZ; 仓库名称: 元件仓; 加工方式: 贴片; 物料名称: 0805  10R  5%  HS  贴片电阻; 规格型号: *
footprint R0805
pins: 1, 2
2 alternate drawings of the same symbol

## RES  0805  12K
designator R?, comment 12K
0805  12K  5%  HS  贴片电阻; 助记码: 0805  12K  5%  HS  TPDZ; 物料代码: 3.01.03.01.02.0034; 仓库名称: 元件仓; 单位: ֻ; 加工方式: 贴片; 物料名称: 0805  12K  5%  HS  贴片电阻; 规格型号: *
footprint R0805
pins: 1, 2
2 alternate drawings of the same symbol

## RES  0805  15K
designator R?, comment 15K
0805  15K  5%  HS  贴片电阻; 物料代码: 3.01.03.01.02.0035; 助记码: 0805  15K  5%  HS  TPDZ; 仓库名称: 元件仓; 单位: ֻ; 加工方式: 贴片; 物料名称: 0805  15K  5%  HS  贴片电阻; 规格型号: *
footprint R0805
pins: 1, 2
2 alternate drawings of the same symbol

## RES  0805  18K
designator R?, comment 18K
0805  18K  5%  HS  贴片电阻; 物料代码: 3.01.03.01.02.0036; 助记码: 0805  18K  5%  HS  TPDZ; 仓库名称: 元件仓; 单位: ֻ; 加工方式: 贴片; 物料名称: 0805  18K  5%  HS  贴片电阻; 规格型号: *
footprint R0805
pins: 1, 2
2 alternate drawings of the same symbol

## RES  0805  20K
designator R?, comment 20K
0805  20K  5%  HS  贴片电阻; 物料代码: 3.01.03.01.02.0037; 助记码: 0805  20K  5%  HS  TPDZ; 仓库名称: 元件仓; 单位: ֻ; 加工方式: 贴片; 物料名称: 0805  20K  5%  HS  贴片电阻; 规格型号: *
footprint R0805
pins: 1, 2
2 alternate drawings of the same symbol

## RES  0805  22K
designator R?, comment 22K
0805  22K  5%  HS  贴片电阻; 物料代码: 3.01.03.01.02.0038; 仓库名称: 元件仓; 助记码: 0805  22K  5%  HS  TPDZ; 单位: ֻ; 加工方式: 贴片; 物料名称: 0805  22K  5%  HS  贴片电阻; 规格型号: *
footprint R0805
pins: 1, 2
2 alternate drawings of the same symbol

## RES  0805  22R
designator R?, comment 22R
0805  22R  5%  HS  贴片电阻; 物料代码: 3.01.03.01.02.0008; 单位: ֻ; 仓库名称: 元件仓; 助记码: 0805  22R  5%  HS  TPDZ; 加工方式: 贴片; 物料名称: 0805  22R  5%  HS  贴片电阻; 规格型号: *
footprint R0805
pins: 1, 2
2 alternate drawings of the same symbol

## RES  0805  24K
designator R?, comment 24K
0805  24K  5%  HS  贴片电阻; 物料代码: 3.01.03.01.02.0039; 仓库名称: 元件仓; 助记码: 0805  24K  5%  HS  TPDZ; 单位: ֻ; 加工方式: 贴片; 物料名称: 0805  24K  5%  HS  贴片电阻; 规格型号: *
footprint R0805
pins: 1, 2
2 alternate drawings of the same symbol

## RES  0805  27K
designator R?, comment 27K
0805  27K  5%  HS  贴片电阻; 助记码: 0805  27K  5%  HS  TPDZ; 物料代码: 3.01.03.01.02.0040; 仓库名称: 元件仓; 单位: ֻ; 加工方式: 贴片; 物料名称: 0805  27K  5%  HS  贴片电阻; 规格型号: *
footprint R0805
pins: 1, 2
2 alternate drawings of the same symbol

## RES  0805  30K
designator R?, comment 30K
0805  30K  5%  HS  贴片电阻; 助记码: 0805  30K  5%  HS  TPDZ; 物料代码: 3.01.03.01.02.0041; 仓库名称: 元件仓; 单位: ֻ; 加工方式: 贴片; 物料名称: 0805  30K  5%  HS  贴片电阻; 规格型号: *
footprint R0805
pins: 1, 2
2 alternate drawings of the same symbol

## RES  0805  33K
designator R?, comment 33K
0805  33K  5%  HS  贴片电阻; 物料代码: 3.01.03.01.02.0003; 助记码: 0805  33K  5%  HS  TPDZ; 仓库名称: 元件仓; 单位: ֻ; 加工方式: 贴片; 物料名称: 0805  33K  5%  HS  贴片电阻; 规格型号: *
footprint R0805
pins: 1, 2
2 alternate drawings of the same symbol

## RES  0805  36K
designator R?, comment 36K
0805  36K  5%  HS  贴片电阻; 物料代码: 3.01.03.01.02.0042; 助记码: 0805  36K  5%  HS  TPDZ; 仓库名称: 元件仓; 单位: ֻ; 加工方式: 贴片; 物料名称: 0805  36K  5%  HS  贴片电阻; 规格型号: *
footprint R0805
pins: 1, 2
2 alternate drawings of the same symbol